# Altium schematic symbol library BARKO_SCHLIB.SchLib: 1064 symbols (part 10 of 11)
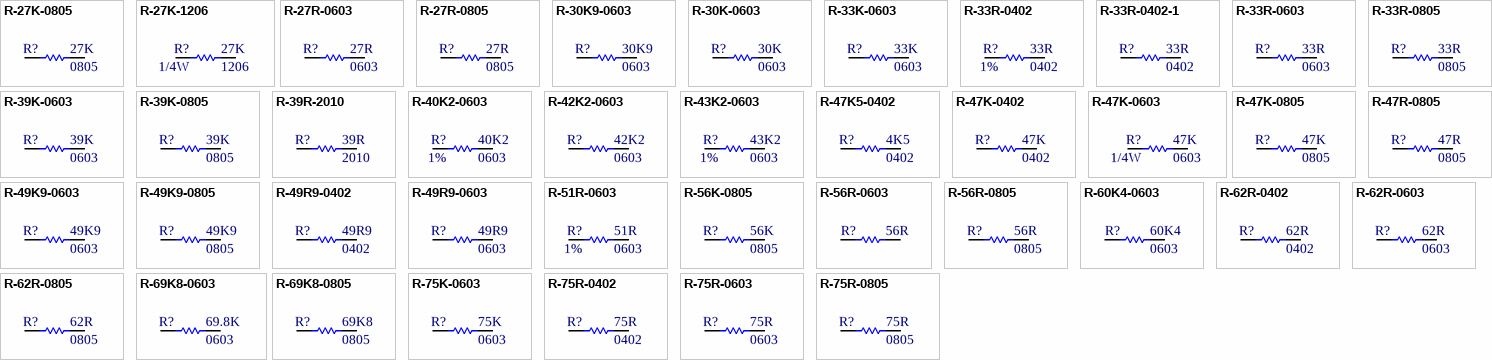
[diagram p50: symbols R-27K-0805 to R-75R-0805]

## R-39K-0603
designator R?, comment 39K  Case Code (Imperial): 0603
RES SMD 39K OHM 5% 1/10W 0603; Manufacturer: Yageo; Manufacturer Part Number: RC0603JR-0739KL; Voltage Rating (DC): 50V; Resistance: 39kR; Power Rating: 100mW; Voltage Rating: 75V; Temperature Coefficient: 100ppm/°C; .PCBCHK: USED; .Creator: F:TALI; Washability: OK; Stock 1: 0; Pricing 1: 1=0.1, 10=0.022, 100=0.0088, 1000=0.00396, 2500=0.00344 (USD); Case/Package: 0603; Number of Pins: 2; Weight: 7.1E-05oz; Case Code (Metric): 1608; Min Operating Temperature: -55°C; Max Operating Temperature: 155°C; Tolerance: 5%; Package Quantity: 1; Packaging: Tape and Reel; Composition: Thick Film; Number of Terminations: 2; Termination: SMD/SMT; Military Standard: Not; Max Power Dissipation: 100mW; Features: Moisture Resistant; Length: 1.6mm; Height: 0.022inch; Width: 0.8mm; Depth: 0.8mm; REACH SVHC: No SVHC; Lead Free: Lead Free; ComponentLink1URL: http://www.yageo.com/documents/recent/PYu-RC_Group_51_RoHS_L_9.pdf; ComponentLink1Description: http://www.yageo.com/documents/recent/PYu-RC_Group_51_RoHS_L_9.pdf; Stock 2: 365350; Pricing 2: 1=0.1, 10=0.043, 100=0.0176, 1000=0.00791, 2500=0.00686 (USD); Mount: Surface Mount; Contact Plating: Tin; Radiation Hardening: No; ComponentLink2URL: http://www.farnell.com/datasheets/1678796.pdf; ComponentLink2Description: http://www.farnell.com/datasheets/1678796.pdf; ComponentLink3URL: https://www.alliedelec.com/m/d/51cd0790071e1666bdb9d00c57fcf960.pdf; ComponentLink3Description: https://www.alliedelec.com/m/d/51cd0790071e1666bdb9d00c57fcf960.pdf; ComponentLink4URL: http://www.jameco.com/Jameco/Products/ProdDS/1988786.pdf; ComponentLink4Description: http://www.jameco.com/Jameco/Products/ProdDS/1988786.pdf; ComponentLink5URL: http://industrial.panasonic.com/www-data/pdf/AOA0000/AOA0000CE1.pdf; ComponentLink5Description: http://industrial.panasonic.com/www-data/pdf/AOA0000/AOA0000CE1.pdf; ComponentLink6URL: http://www.farnell.com/datasheets/1500035.pdf; ComponentLink6Description: http://www.farnell.com/datasheets/1500035.pdf; Stock 3: 400871; Pricing 3: 1=0.1, 10=0.065, 100=0.0264, 1000=0.01186, 2500=0.01029 (USD); ComponentLink7URL: http://www.farnell.com/datasheets/1678782.pdf; ComponentLink7Description: http://www.farnell.com/datasheets/1678782.pdf; ComponentLink8URL: http://industrial.panasonic.com/www-data/pdf/AOA0000/AOA0000CE2.pdf; ComponentLink8Description: http://industrial.panasonic.com/www-data/pdf/AOA0000/AOA0000CE2.pdf; ComponentLink9URL: http://www.mouser.com/ds/2/315/AOA0000C283-1093288.pdf; ComponentLink9Description: http://www.mouser.com/ds/2/315/AOA0000C283-1093288.pdf; ComponentLink10URL: http://www.farnell.com/datasheets/1911175.pdf; ComponentLink10Description: http://www.farnell.com/datasheets/1911175.pdf; ComponentLink11URL: http://www.farnell.com/datasheets/443971.pdf; ComponentLink11Description: http://www.farnell.com/datasheets/443971.pdf; .SCHCHK: USED; Supplier 1: Digi-Key; Supplier Part Number 1: 311-39KGRDKR-ND
footprint R-0603
pins: 1, 2

## R-39K-0805
designator R?, comment 39K  Case Code (Imperial): 0805
RES SMD 39K OHM 5% 1/8W 0805; Manufacturer: Yageo; Manufacturer Part Number: RC0805JR-0739KL; Resistance: 39kR; Temperature Coefficient: 100ppm/°C; Power Rating: 125mW; Voltage Rating: 150V; .PCBCHK: USED; .Creator: F:TALI; Washability: OK; Stock 1: 190; Pricing 1: 1=0.1, 10=0.039, 100=0.0159, 1000=0.00716, 2500=0.00622 (USD); Case/Package: 0805; Contact Plating: Lead,Matte,Tin; Case Code (Metric): 2012; Min Operating Temperature: -55°C; Max Operating Temperature: 155°C; Tolerance: 5%; Composition: Thick Film; Packaging: Tape and Reel; Package Quantity: 1; Termination: SMD/SMT; Number of Terminations: 2; Military Standard: Not; Max Power Dissipation: 125mW; Features: Moisture Resistant; Length: 2mm; Height: 0.024inch; Width: 1.25mm; Depth: 1.25mm; Radiation Hardening: No; REACH SVHC: Unknown; Lead Free: Lead Free; ComponentLink1URL: http://www.yageo.ru/pdf/RC0805.pdf; ComponentLink1Description: http://www.yageo.ru/pdf/RC0805.pdf; ComponentLink2URL: http://www.yageo.com.tw/exep/pages/download/literatures/PYu-R_INT-thick_7.pdf; ComponentLink2Description: http://www.yageo.com.tw/exep/pages/download/literatures/PYu-R_INT-thick_7.pdf; ComponentLink3URL: http://www.yageo.com/documents/recent/PYu-RC_Group_51_RoHS_L_9.pdf; ComponentLink3Description: http://www.yageo.com/documents/recent/PYu-RC_Group_51_RoHS_L_9.pdf; Stock 2: 729088; Pricing 2: 1=0.1, 10=0.081, 100=0.0311, 1000=0.01367, 2500=0.01181 (USD); Mount: Surface Mount; Number of Pins: 2; Weight: 0.000194oz; Voltage Rating (DC): 150V; Working Voltage: 150V; ComponentLink4URL: http://www.farnell.com/datasheets/426256.pdf; ComponentLink4Description: http://www.farnell.com/datasheets/426256.pdf; ComponentLink5URL: https://industrial.panasonic.com/cdbs/www-data/pdf/RDA0000/DMA0000COL11.pdf; ComponentLink5Description: https://industrial.panasonic.com/cdbs/www-data/pdf/RDA0000/DMA0000COL11.pdf; ComponentLink6URL: https://industrial.panasonic.com/cdbs/www-data/pdf/RDA0000/AOA0000C304.pdf; ComponentLink6Description: https://industrial.panasonic.com/cdbs/www-data/pdf/RDA0000/AOA0000C304.pdf; ComponentLink7URL: http://www.farnell.com/datasheets/1678782.pdf; ComponentLink7Description: http://www.farnell.com/datasheets/1678782.pdf; Stock 3: 342774; Pricing 3: 1=0.1, 10=0.021, 100=0.0086, 1000=0.00385, 2500=0.00334 (USD); .SCHCHK: USED; Supplier 1: Digi-Key; Supplier Part Number 1: RMCF0805JT39K0DKR-ND
footprint R-0805
pins: 1, 2

## R-39R-2010
designator R?, comment 39R  Package / Case: 2010
CRGP 2010 39R 1%; Manufacturer: TE Connectivity; Manufacturer Part Number: CRGP2010F39R; .Creator: M.OZKAN; .PCBCHK: USED; Supplier 1: Digi-Key; Supplier Part Number 1: A130643CT-ND; Stock: 21676; Pricing: 1=0.41, 10=0.315, 100=0.1324, 1000=0.0731 (USD); RoHS: No; .SCHCHK: USED
footprint R-2010
pins: 1, 2

## R-40K2-0603
designator R?, comment 40K2  Tolerance: 1%  Case/Package: 0603
RES 40.2K OHM 1% 1/10W 0603; Manufacturer: Stackpole Electronics; Manufacturer Part Number: RMCF0603FT40K2; Resistance: 40.2kR; Temperature Coefficient: 100ppm/°C; Max Power Dissipation: 100mW; Washability: OK; .Creator: M.OZKAN; .PCBCHK: USED; Supplier 1: Digi-Key; Supplier Part Number 1: RMCF0603FT40K2CT-ND; Stock 1: 104014; Pricing 1: 1=0.10000, 10=0.01600, 100=0.00650, 1000=0.00292, 2500=0.00253 (USD); RoHS: Yes; Mount: Surface Mount; Case Code (Imperial): 0603; Contact Plating: Tin,Matte; Case Code (Metric): 1608; Min Operating Temperature: -55°C; Max Operating Temperature: 155°C; Composition: Thick Film; Packaging: Tape and Reel; Number of Terminations: 2; Features: Automotive AEC-Q200; Power Rating: 100mW; Length: 0.061inch; Height: 0.022inch; Width: 0.031inch; Radiation Hardening: No; Lead Free: Lead Free; ComponentLink1URL: http://components.arrow.com/part/dataview/47804758S9848883N1174?src-supplier=Arrow; ComponentLink1Description: http://components.arrow.com/part/dataview/47804758S9848883N1174?src-supplier=Arrow; ComponentLink2URL: https://www.seielect.com/catalog/SEI-RMCF_RMCP.pdf?src-supplier=Avnet; ComponentLink2Description: https://www.seielect.com/catalog/SEI-RMCF_RMCP.pdf?src-supplier=Avnet; ComponentLink3URL: http://www.seielect.com/Catalog/SEI-RMC.pdf?src-supplier=Future+Electronics; ComponentLink3Description: http://www.seielect.com/Catalog/SEI-RMC.pdf?src-supplier=Future+Electronics; ComponentLink4URL: https://www.seielect.com/catalog/SEI-Packaging.pdf?src-supplier=Digi-Key; ComponentLink4Description: https://www.seielect.com/catalog/SEI-Packaging.pdf?src-supplier=Digi-Key; ComponentLink5URL: https://www.seielect.com/catalog/SEI-RMCF_RMCP.pdf?src-supplier=Avnet+Asia; ComponentLink5Description: https://www.seielect.com/catalog/SEI-RMCF_RMCP.pdf?src-supplier=Avnet+Asia; .SCHCHK: USED
footprint R-0603
pins: 1, 2

## R-42K2-0603
designator R?, comment 42K2  Case Code (Imperial): 0603
RES 42.2K OHM 1% 1/10W 0603; Manufacturer: Stackpole Electronics; Manufacturer Part Number: RMCF0603FT42K2; Power Rating: 100mW; Resistance: 42.2kR; Temperature Coefficient: 100ppm/°C; Washability: OK; .Creator: M.OZKAN; .PCBCHK: USED; Supplier 1: Arrow; Stock 1: 9123; Pricing 1: 1=0,09500, 10=0,01600, 25=0,01590, 100=0,00640, 250=0,00630, 500=0,00620, 1000=0,00370, 3000=0,00230, 6000=0,00190 (USD); RoHS: Yes; Mount: Surface Mount; Case/Package: 0603; Case Code (Metric): 1608; Contact Plating: Tin,Matte; Min Operating Temperature: -55°C; Max Operating Temperature: 155°C; Packaging: Tape and Reel; Tolerance: 1%; Composition: Thick Film; Number of Terminations: 2; Military Standard: Not; Max Power Dissipation: 100mW; Features: Automotive AEC-Q200; Length: 1.55mm; Height: 0.022inch; Width: 0.031inch; Depth: 0.8mm; Radiation Hardening: No; Lead Free: Lead Free; ComponentLink1URL: http://components.arrow.com/part/dataview/44987958S7722041N1174?src-supplier=Arrow; ComponentLink1Description: http://components.arrow.com/part/dataview/44987958S7722041N1174?src-supplier=Arrow; ComponentLink2URL: https://www.seielect.com/catalog/SEI-Packaging.pdf?src-supplier=Digi-Key; ComponentLink2Description: https://www.seielect.com/catalog/SEI-Packaging.pdf?src-supplier=Digi-Key; ComponentLink3URL: https://www.seielect.com/Catalog/SEI-RMCF_RMCP.pdf?src-supplier=Digi-Key; ComponentLink3Description: https://www.seielect.com/Catalog/SEI-RMCF_RMCP.pdf?src-supplier=Digi-Key; ComponentLink4URL: https://www.verical.com/server-webapp/html/getDatasheet?partID=422319&src-supplier=Verical; ComponentLink4Description: https://www.verical.com/server-webapp/html/getDatasheet?partID=422319&src-supplier=Verical; ComponentLink5URL: http://www.seielect.com/Catalog/SEI-RMC.pdf?src-supplier=Future+Electronics; ComponentLink5Description: http://www.seielect.com/Catalog/SEI-RMC.pdf?src-supplier=Future+Electronics; ComponentLink6URL: https://www.seielect.com/catalog/SEI-RMCF_RMCP.pdf?src-supplier=Avnet; ComponentLink6Description: https://www.seielect.com/catalog/SEI-RMCF_RMCP.pdf?src-supplier=Avnet; Supplier Part Number 1: RMCF0603FT42K2; .SCHCHK: USED
footprint R-0603
pins: 1, 2

## R-43K2-0603
designator R?, comment 43K2  Tolerance: 1%  Case/Package: 0603
RES SMD 43.2K OHM 1% 1/10W 0603; Manufacturer: Stackpole Electronics; Manufacturer Part Number: RMCF0603FT43K2; Max Power Dissipation: 100mW; Temperature Coefficient: 100ppm/°C; Resistance: 43.2kR; .Creator: M.OZKAN; .PCBCHK: USED; Supplier 1: Digi-Key; Supplier Part Number 1: RMCF0603FT43K2CT-ND; Stock: 13062; Pricing: 1=0.1, 10=0.016, 100=0.0065, 1000=0.0029, 2500=0.0025 (USD); RoHS: Yes; Mount: Surface Mount; Case Code (Imperial): 0603; Contact Plating: Tin,Matte; Case Code (Metric): 1608; Min Operating Temperature: -55°C; Max Operating Temperature: 155°C; Features: Automotive AEC-Q200; Power Rating: 100mW; Packaging: Tape and Reel; Composition: Thick Film; Number of Terminations: 2; Military Standard: Not; Length: 0.061inch; Height: 0.022inch; Width: 0.031inch; Depth: 0.8mm; Radiation Hardening: No; Lead Free: Lead Free; ComponentLink1URL: https://datasheet.ciiva.com/26919/getdatasheetpartid-733470-26919527.pdf?src-supplier=Verical; ComponentLink1Description: https://datasheet.ciiva.com/26919/getdatasheetpartid-733470-26919527.pdf?src-supplier=Verical; .SCHCHK: USED
footprint R-0603
pins: 1, 2

## R-47K5-0402
designator R?, comment 4K5  Case Code (Imperial): 0402
RES SMD 47.5K OHM 1% 1/16W 0402; Manufacturer: Vishay Dale; Manufacturer Part Number: CRCW040247K5FKEDC; Resistance: 47.5kR; Power Rating: 62.5mW; Voltage Rating: 50V; Temperature Coefficient: 100ppm/°C; Max Power Dissipation: 100mW; .PCBCHK: USED; .Creator: F:TALI; Washability: OK; Stock 1: 266682; Pricing 1: 1=0.1, 10=0.026, 100=0.0104, 1000=0.00466, 2500=0.00405, 5000=0.00334 (USD); Stock 2: 2901452; Pricing 2: 1=0.1, 10=0.018, 100=0.0073, 1000=0.00329, 2500=0.00286, 5000=0.00236 (USD); Case/Package: 0402; Case Code (Metric): 1005; Min Operating Temperature: -55°C; Max Operating Temperature: 155°C; Tolerance: 1%; Packaging: Tape and Reel; Termination: SMD/SMT; Composition: Thick Film; Military Standard: Not; Voltage Rating (DC): 50V; Length: 1mm; Depth: 0.5mm; REACH SVHC: No SVHC; Lead Free: Lead Free; ComponentLink1URL: http://www.yageo.com/documents/recent/PYu-RC0402_51_RoHS_L_6_r.pdf; ComponentLink1Description: http://www.yageo.com/documents/recent/PYu-RC0402_51_RoHS_L_6_r.pdf; ComponentLink2URL: http://www.farnell.com/datasheets/1018594.pdf; ComponentLink2Description: http://www.farnell.com/datasheets/1018594.pdf; ComponentLink3URL: http://www.mouser.com/ds/2/447/PYu-RC0402_51_RoHS_L_6_r-8721.pdf; ComponentLink3Description: http://www.mouser.com/ds/2/447/PYu-RC0402_51_RoHS_L_6_r-8721.pdf; Stock 3: 1296555; Pricing 3: 1=0.1, 10=0.045, 100=0.0183, 1000=0.00823, 2500=0.00715, 5000=0.0059 (USD); Mount: Surface Mount; Contact Plating: Tin; Package Quantity: 1; Number of Terminations: 2; Features: Automotive AEC-Q200; Height: 0.35mm; Width: 0.02inch; ComponentLink4URL: http://www.alliedelec.com/m/d/623f45ff1957d936ff56d46fd1c28cac.pdf; ComponentLink4Description: http://www.alliedelec.com/m/d/623f45ff1957d936ff56d46fd1c28cac.pdf; ComponentLink5URL: http://www.farnell.com/datasheets/1911175.pdf; ComponentLink5Description: http://www.farnell.com/datasheets/1911175.pdf; ComponentLink6URL: http://www.farnell.com/datasheets/426256.pdf; ComponentLink6Description: http://www.farnell.com/datasheets/426256.pdf; .SCHCHK: USED; Supplier 1: Digi-Key; Supplier Part Number 1: 311-47.5KLRCT-ND
footprint R-0402
pins: 1, 2

## R-47K-0402
designator R?, comment 47K  Case/Package: 0402
RES 47K OHM 5% 1/16W 0402; Manufacturer: Stackpole Electronics; Manufacturer Part Number: RMCF0402JT47K0; Resistance: 47kR; Power Rating: 63mW; Temperature Coefficient: 100ppm/°C; Washability: OK; .Creator: M.OZKAN; .PCBCHK: USED; Supplier 1: Digi-Key; Stock 1: 178723; Pricing 1: 1=0.10000, 10=0.01200, 100=0.00480, 1000=0.00214, 2500=0.00186, 5000=0.00154 (USD); RoHS: Yes; Mount: Surface Mount; Case Code (Metric): 1005; Case Code (Imperial): 0402; Contact Plating: Tin,Matte; Min Operating Temperature: -55°C; Max Operating Temperature: 155°C; Tolerance: 5%; Packaging: Tape and Reel; Composition: Thick Film; Number of Terminations: 2; Max Power Dissipation: 63mW; Features: Automotive AEC-Q200; Length: 0.039inch; Height: 0.016inch; Width: 0.02inch; Lead Free: Lead Free; ComponentLink1URL: http://components.arrow.com/part/dataview/50586133S9963687N1174?src-supplier=Arrow; ComponentLink1Description: http://components.arrow.com/part/dataview/50586133S9963687N1174?src-supplier=Arrow; ComponentLink2URL: http://www.seielect.com/Catalog/SEI-rmc.pdf?src-supplier=Future+Electronics; ComponentLink2Description: http://www.seielect.com/Catalog/SEI-rmc.pdf?src-supplier=Future+Electronics; ComponentLink3URL: https://www.seielect.com/Catalog/SEI-RMCF_RMCP.pdf?src-supplier=Avnet; ComponentLink3Description: https://www.seielect.com/Catalog/SEI-RMCF_RMCP.pdf?src-supplier=Avnet; ComponentLink4URL: https://www.seielect.com/catalog/SEI-Packaging.pdf?src-supplier=Digi-Key; ComponentLink4Description: https://www.seielect.com/catalog/SEI-Packaging.pdf?src-supplier=Digi-Key; Supplier Part Number 1: RMCF0402JT47K0CT-ND; .SCHCHK: USED
footprint R-0402
pins: 1, 2

## R-47K-0603
designator R?, comment 47K  Max Power Dissipation: 1/4W  Case Code (Imperial): 0603
RES SMD 47K OHM 5% 1/4W 0603; Manufacturer: Panasonic; Manufacturer Part Number: ERJ-PA3J473V; Resistance: 47kR; Temperature Coefficient: 200ppm/°C; Power Rating: 63mW; Voltage Rating: 75V; .PCBCHK: USED; .Creator: F:TALI; Washability: OK; Stock 1: 1868; Pricing 1: 1=0.11, 10=0.1, 100=0.0384, 1000=0.0169, 2500=0.0146 (USD); Case/Package: 0603; Case Code (Metric): 1608; Min Operating Temperature: -55°C; Max Operating Temperature: 155°C; Packaging: Tape and Reel; Composition: Thick Film; Number of Terminations: 2; Tolerance: 5%; Features: Automotive AEC-Q200; Length: 0.063inch; Height: 0.018inch; Width: 0.031inch; Stock 2: 37656; Pricing 2: 1=0.1, 10=0.087, 100=0.0333, 1000=0.01464, 2500=0.01264 (USD); Package Quantity: 1; ComponentLink1URL: http://www.rohm.com/web/global/datasheet/ESR01MZPF/esr-e; ComponentLink1Description: http://www.rohm.com/web/global/datasheet/ESR01MZPF/esr-e; ComponentLink2URL: https://www.rohm.com/datasheet/ESR01MZPF/esr-e; ComponentLink2Description: https://www.rohm.com/datasheet/ESR01MZPF/esr-e; Stock 3: 71198; Pricing 3: 1=0.11, 10=0.098, 100=0.0376, 1000=0.01654, 2500=0.01428 (USD); Number of Pins: 2; Voltage Rating (DC): 75V; Termination: SMD/SMT; Depth: 0.8mm; REACH SVHC: Unknown; Lead Free: Lead Free; ComponentLink3URL: http://documents.rs-components.com/techlib://itc_doclist_GB.htm?stockno=3915371; ComponentLink3Description: http://documents.rs-components.com/techlib://itc_doclist_GB.htm?stockno=3915371; ComponentLink4URL: http://www.farnell.com/datasheets/87330.pdf; ComponentLink4Description: http://www.farnell.com/datasheets/87330.pdf; .SCHCHK: USED; Supplier 1: Digi-Key; Supplier Part Number 1: P47KBZDKR-ND
footprint R-0603
pins: 1, 2

## R-47K-0805
designator R?, comment 47K  Case Code (Imperial): 0805
RES SMD 47K 1/8W 5% 0805; Manufacturer: Samsung; Manufacturer Part Number: RC2012J473CS; Resistance: 47kR; Temperature Coefficient: 100ppm/°C; Power Rating: 125mW; Voltage Rating (DC): 150V; .PCBCHK: USED; .Creator: F:TALI; Washability: OK; Case/Package: 0805; Contact Plating: Tin; Case Code (Metric): 2012; Min Operating Temperature: -55°C; Max Operating Temperature: 155°C; Tolerance: 5%; Composition: Thick Film; Packaging: Tape and Reel; Number of Terminations: 2; Military Standard: Not; Max Power Dissipation: 125mW; Features: Moisture Resistant; Length: 0.079inch; Height: 0.024inch; Width: 0.049inch; Depth: 1.25mm; Radiation Hardening: No; Lead Free: Lead Free; Stock 1: 15535; Pricing 1: 1=0.19, 10=0.16, 100=0.0624, 1000=0.02614, 2500=0.02396 (USD); Package Quantity: 1; ComponentLink1URL: http://www.rohm.com/web/global/datasheet/KTR03EZPF/ktr-e; ComponentLink1Description: http://www.rohm.com/web/global/datasheet/KTR03EZPF/ktr-e; Mount: Surface Mount; ComponentLink2URL: http://www.te.com/commerce/DocumentDelivery/DDEController?Action=srchrtrv&DocNm=1773204&DocType=DS&DocLang=English; ComponentLink2Description: http://www.te.com/commerce/DocumentDelivery/DDEController?Action=srchrtrv&DocNm=1773204&DocType=DS&DocLang=English; ComponentLink3URL: http://www.te.com/commerce/DocumentDelivery/DDEController?Action=showdoc&DocId=Data+Sheet%7F1773204%7FF%7Fpdf%7FEnglish%7FENG_DS_1773204_F.pdf; ComponentLink3Description: http://www.te.com/commerce/DocumentDelivery/DDEController?Action=showdoc&DocId=Data+Sheet%7F1773204%7FF%7Fpdf%7FEnglish%7FENG_DS_1773204_F.pdf; ComponentLink4URL: http://www.onlinecomponents.com/productFiles/mf-AMP/eng_ds_1773204_e.pdf; ComponentLink4Description: http://www.onlinecomponents.com/productFiles/mf-AMP/eng_ds_1773204_e.pdf; Stock 2: 4221239; Pricing 2: 1=0.1, 10=0.046, 100=0.0186, 1000=0.00835, 2500=0.00725 (USD); Number of Pins: 2; Voltage Rating: 150V; Termination: SMD/SMT; REACH SVHC: Unknown; ComponentLink5URL: http://www.farnell.com/datasheets/1686128.pdf; ComponentLink5Description: http://www.farnell.com/datasheets/1686128.pdf; ComponentLink6URL: http://www.farnell.com/datasheets/444164.pdf; ComponentLink6Description: http://www.farnell.com/datasheets/444164.pdf; ComponentLink7URL: http://www.yageo.ru/pdf/RC0805.pdf; ComponentLink7Description: http://www.yageo.ru/pdf/RC0805.pdf; Stock 3: 763547; Pricing 3: 1=0.1, 10=0.061, 100=0.0249, 1000=0.0112, 2500=0.00972 (USD); Working Voltage: 150V; ComponentLink8URL: http://www.farnell.com/datasheets/2371628.pdf; ComponentLink8Description: http://www.farnell.com/datasheets/2371628.pdf; ComponentLink9URL: http://industrial.panasonic.com/www-data/pdf/AOA0000/AOA0000CE1.pdf; ComponentLink9Description: http://industrial.panasonic.com/www-data/pdf/AOA0000/AOA0000CE1.pdf; ComponentLink10URL: http://www.mouser.com/ds/2/315/AOA0000CE1-37422.pdf; ComponentLink10Description: http://www.mouser.com/ds/2/315/AOA0000CE1-37422.pdf; ComponentLink11URL: https://industrial.panasonic.com/cdbs/www-data/pdf/RDA0000/AOA0000C301.pdf; ComponentLink11Description: https://industrial.panasonic.com/cdbs/www-data/pdf/RDA0000/AOA0000C301.pdf; ComponentLink12URL: http://www.farnell.com/datasheets/1500035.pdf; ComponentLink12Description: http://www.farnell.com/datasheets/1500035.pdf; ComponentLink13URL: http://www.farnell.com/datasheets/2059623.pdf; ComponentLink13Description: http://www.farnell.com/datasheets/2059623.pdf; ComponentLink14URL: http://www.farnell.com/datasheets/1678796.pdf; ComponentLink14Description: http://www.farnell.com/datasheets/1678796.pdf; .SCHCHK: USED; Supplier 1: Digi-Key; Supplier Part Number 1: RHM47.0KAHDKR-ND
footprint R-0805
pins: 1, 2

## R-47R-0805
designator R?, comment 47R  Case/Package: 0805
RES SMD 47 OHM 1% 1/8W 0805; Manufacturer: Yageo; Manufacturer Part Number: RC0805FR-0747RL; Temperature Coefficient: 100ppm/°C; Power Rating: 125mW; Voltage Rating: 150V; .PCBCHK: USED; .Creator: F:TALI; Washability: OK; Stock 1: 122904; Pricing 1: 1=0.1, 10=0.046, 100=0.0186, 1000=0.00835, 2500=0.00725 (USD); Case Code (Metric): 2012; Case Code (Imperial): 0805; Min Operating Temperature: -55°C; Max Operating Temperature: 155°C; Resistance: 47R; Tolerance: 1%; Composition: Thick Film; Packaging: Tape and Reel; Package Quantity: 1; Number of Terminations: 2; Termination: SMD/SMT; Military Standard: Not; Max Power Dissipation: 125mW; Features: Moisture Resistant; Length: 2mm; Height: 0.024inch; Width: 0.049inch; Depth: 1.25mm; REACH SVHC: Unknown; Lead Free: Lead Free; ComponentLink1URL: http://documents.rs-components.com/techlib://itc_doclist_GB.htm?stockno=6182574; ComponentLink1Description: http://documents.rs-components.com/techlib://itc_doclist_GB.htm?stockno=6182574; ComponentLink2URL: http://www.yageo.com/documents/recent/PYu-RC_Group_51_RoHS_L_9.pdf; ComponentLink2Description: http://www.yageo.com/documents/recent/PYu-RC_Group_51_RoHS_L_9.pdf; ComponentLink3URL: http://www.yageo.ru/pdf/RC0805.pdf; ComponentLink3Description: http://www.yageo.ru/pdf/RC0805.pdf; ComponentLink4URL: http://www.farnell.com/datasheets/444164.pdf; ComponentLink4Description: http://www.farnell.com/datasheets/444164.pdf; ComponentLink5URL: http://www.mouser.com/ds/2/447/Yageo_08112016_RC0805-968729.pdf; ComponentLink5Description: http://www.mouser.com/ds/2/447/Yageo_08112016_RC0805-968729.pdf; Stock 2: 717764; Pricing 2: 1=0.1, 10=0.061, 100=0.0249, 1000=0.0112, 2500=0.00972 (USD); Mount: Surface Mount; Contact Plating: Tin; Voltage Rating (DC): 150V; Radiation Hardening: No; ComponentLink6URL: http://farnell.com//datasheets/2371628.pdf; ComponentLink6Description: http://farnell.com//datasheets/2371628.pdf; ComponentLink7URL: https://www.alliedelec.com/m/d/51cd0790071e1666bdb9d00c57fcf960.pdf; ComponentLink7Description: https://www.alliedelec.com/m/d/51cd0790071e1666bdb9d00c57fcf960.pdf; ComponentLink8URL: http://www.farnell.com/datasheets/1678796.pdf; ComponentLink8Description: http://www.farnell.com/datasheets/1678796.pdf; ComponentLink9URL: http://www.farnell.com/datasheets/1500035.pdf; ComponentLink9Description: http://www.farnell.com/datasheets/1500035.pdf; ComponentLink10URL: https://www.verical.com/server-webapp/html/getDatasheet?partID=249048; ComponentLink10Description: https://www.verical.com/server-webapp/html/getDatasheet?partID=249048; ComponentLink11URL: http://industrial.panasonic.com/www-data/pdf/AOA0000/AOA0000CE1.pdf; ComponentLink11Description: http://industrial.panasonic.com/www-data/pdf/AOA0000/AOA0000CE1.pdf; ComponentLink12URL: http://www.jameco.com/Jameco/Products/ProdDS/1989914.pdf; ComponentLink12Description: http://www.jameco.com/Jameco/Products/ProdDS/1989914.pdf; Stock 3: 137564; Pricing 3: 1=0.1, 10=0.021, 100=0.0086, 1000=0.00385, 2500=0.00334 (USD); .SCHCHK: USED; Supplier 1: Digi-Key; Supplier Part Number 1: 311-47.0CRDKR-ND
footprint R-0805
pins: 1, 2

## R-49K9-0603
designator R?, comment 49K9  Case Code (Imperial): 0603
RES SMD 49.9K OHM 1% 1/10W 0603; Manufacturer: Yageo; Manufacturer Part Number: RC0603FR-0749K9L; Power Rating: 100mW; Resistance: 49.9kR; Temperature Coefficient: 100ppm/°C; Voltage Rating (DC): 50V; .PCBCHK: USED; .Creator: F:TALI; Washability: OK; Stock 1: 4878176; Pricing 1: 1=0.1, 10=0.026, 100=0.0107, 1000=0.00478, 2500=0.00415 (USD); Mount: Surface Mount; Case/Package: 0603; Case Code (Metric): 1608; Min Operating Temperature: -55°C; Max Operating Temperature: 155°C; Tolerance: 1%; Packaging: Tape and Reel; Package Quantity: 1; Voltage Rating: 50V; Composition: Thick Film; Number of Terminations: 2; Termination: SMD/SMT; Military Standard: Not; Max Power Dissipation: 100mW; Features: Moisture Resistant; Length: 0.063inch; Height: 0.022inch; Width: 0.031inch; Depth: 0.8mm; Lead Free: Lead Free; ComponentLink1URL: http://documents.rs-components.com/techlib://itc_doclist_GB.htm?stockno=5047537; ComponentLink1Description: http://documents.rs-components.com/techlib://itc_doclist_GB.htm?stockno=5047537; ComponentLink2URL: https://www.verical.com/server-webapp/html/getDatasheet?partID=323805; ComponentLink2Description: https://www.verical.com/server-webapp/html/getDatasheet?partID=323805; ComponentLink3URL: http://www.yageo.com/documents/recent/PYu-RC_Group_51_RoHS_L_9.pdf; ComponentLink3Description: http://www.yageo.com/documents/recent/PYu-RC_Group_51_RoHS_L_9.pdf; Stock 2: 1796687; Pricing 2: 1=0.1, 10=0.065, 100=0.0264, 1000=0.01186, 2500=0.01029 (USD); Weight: 7.1E-05oz; Contact Plating: Tin; Radiation Hardening: No; REACH SVHC: No SVHC; ComponentLink4URL: http://www.farnell.com/datasheets/1911175.pdf; ComponentLink4Description: http://www.farnell.com/datasheets/1911175.pdf; ComponentLink5URL: http://www.farnell.com/datasheets/426256.pdf; ComponentLink5Description: http://www.farnell.com/datasheets/426256.pdf; ComponentLink6URL: http://industrial.panasonic.com/www-data/pdf/AOA0000/AOA0000CE2.pdf; ComponentLink6Description: http://industrial.panasonic.com/www-data/pdf/AOA0000/AOA0000CE2.pdf; ComponentLink7URL: http://www.farnell.com/datasheets/1678782.pdf; ComponentLink7Description: http://www.farnell.com/datasheets/1678782.pdf; ComponentLink8URL: https://www.verical.com/server-webapp/html/getDatasheet?partID=52039; ComponentLink8Description: https://www.verical.com/server-webapp/html/getDatasheet?partID=52039; ComponentLink9URL: http://www.jameco.com/Jameco/Products/ProdDS/1988209.pdf; ComponentLink9Description: http://www.jameco.com/Jameco/Products/ProdDS/1988209.pdf; Stock 3: 57477; Pricing 3: 1=0.1, 10=0.032, 100=0.0129, 1000=0.00579, 2500=0.00502 (USD); .SCHCHK: USED; Supplier 1: Digi-Key; Supplier Part Number 1: 311-49.9KHRCT-ND
footprint R-0603
pins: 1, 2

## R-49K9-0805
designator R?, comment 49K9  Case Code (Imperial): 0805
RES SMD 49.9K OHM 1% 1/8W 0805; Manufacturer: Stackpole Electronics; Manufacturer Part Number: RMCF0805FT49K9; Resistance: 49.9kR; Temperature Coefficient: 100ppm/°C; Power Rating: 125mW; Voltage Rating: 100V; .PCBCHK: USED; .Creator: F:TALI; Washability: OK; Supplier 1: Digi-Key; Supplier Part Number 1: RMCF0805FT49K9DKR-ND; Stock 1: 71857; Pricing 1: 1=0.1, 10=0.028, 100=0.0114, 1000=0.00513, 2500=0.00445 (USD); Mount: Surface Mount; Case/Package: 0805; Case Code (Metric): 2012; Contact Plating: Matte,Tin; Min Operating Temperature: -55°C; Max Operating Temperature: 155°C; Packaging: Tape and Reel; Tolerance: 1%; Composition: Thick Film; Number of Terminations: 2; Max Power Dissipation: 125mW; Package Quantity: 1; Military Standard: Not; Features: Automotive AEC-Q200; Length: 2mm; Height: 0.026inch; Width: 0.049inch; Depth: 1.25mm; Radiation Hardening: No; Lead Free: Lead Free; Weight: 0.000194oz; Voltage Rating (DC): 100V; Termination: SMD/SMT; REACH SVHC: Unknown; .SCHCHK: USED
footprint R-0805
pins: 1, 2

## R-49R9-0402
designator R?, comment 49R9  Case Code (Imperial): 0402
RES SMD 49.9 OHM 1% 1/16W 0402; Manufacturer: Vishay Semiconductors; Manufacturer Part Number: CRCW040249R9FKEDC; Temperature Coefficient: 100ppm/°C; Resistance: 49.9R; Power Rating: 62.5mW; Max Power Dissipation: 63mW; Voltage Rating: 50V; .PCBCHK: USED; .Creator: F:TALI; Washability: OK; Stock 1: 1212049; Pricing 1: 1=0.1, 10=0.026, 100=0.0104, 1000=0.00466, 2500=0.00405, 5000=0.00334 (USD); Mount: Surface Mount; Case/Package: SMD/SMT; Contact Plating: Tin; Min Operating Temperature: -55°C; Max Operating Temperature: 155°C; Composition: Thick Film; Tolerance: 1%; Termination: Wraparound; Length: 1mm; Lead Free: Lead Free; Stock 2: 2233063; Pricing 2: 1=0.1, 10=0.021, 100=0.0087, 1000=0.00391, 2500=0.00339, 5000=0.0028 (USD); Case Code (Metric): 1005; Packaging: Tape and Reel; Military Standard: Not; Number of Terminations: 2; Features: Moisture Resistant; Height: 0.016inch; Width: 0.02inch; Depth: 0.5mm; Radiation Hardening: No; ComponentLink1URL: https://www.verical.com/server-webapp/html/getDatasheet?partID=644783; ComponentLink1Description: https://www.verical.com/server-webapp/html/getDatasheet?partID=644783; ComponentLink2URL: http://www1.futureelectronics.com/doc/SAMSUNG/RCSERIES.pdf; ComponentLink2Description: http://www1.futureelectronics.com/doc/SAMSUNG/RCSERIES.pdf; ComponentLink3URL: https://produktinfo.conrad.com/datenblaetter/625000-649999/631101-da-01-en-SMD_WID_RC_1005_49R9_1__0_063W_10000ST.pdf; ComponentLink3Description: https://produktinfo.conrad.com/datenblaetter/625000-649999/631101-da-01-en-SMD_WID_RC_1005_49R9_1__0_063W_10000ST.pdf; Stock 3: 74971; Pricing 3: 1=0.12, 10=0.107, 100=0.0412, 1000=0.01815, 2500=0.01567, 5000=0.01402 (USD); Package Quantity: 10000; ComponentLink4URL: http://www.mouser.com/ds/2/315/AOA0000C283-1093288.pdf; ComponentLink4Description: http://www.mouser.com/ds/2/315/AOA0000C283-1093288.pdf; Voltage Rating (DC): 50V; REACH SVHC: No SVHC; ComponentLink5URL: http://industrial.panasonic.com/www-data/pdf/AOA0000/AOA0000CE1.pdf; ComponentLink5Description: http://industrial.panasonic.com/www-data/pdf/AOA0000/AOA0000CE1.pdf; ComponentLink6URL: http://www.farnell.com/datasheets/1500035.pdf; ComponentLink6Description: http://www.farnell.com/datasheets/1500035.pdf; ComponentLink7URL: https://www.alliedelec.com/m/d/51cd0790071e1666bdb9d00c57fcf960.pdf; ComponentLink7Description: https://www.alliedelec.com/m/d/51cd0790071e1666bdb9d00c57fcf960.pdf; ComponentLink8URL: http://www.farnell.com/datasheets/1678796.pdf; ComponentLink8Description: http://www.farnell.com/datasheets/1678796.pdf; ComponentLink9URL: http://www.farnell.com/datasheets/2059623.pdf; ComponentLink9Description: http://www.farnell.com/datasheets/2059623.pdf; .SCHCHK: USED; Supplier 1: Digi-Key; Supplier Part Number 1: 1276-3469-1-ND
footprint R-0402
pins: 1, 2

## R-49R9-0603
designator R?, comment 49R9  Case/Package: 0603
RES 49.9 OHM 1% 1/10W 0603; Manufacturer: Stackpole Electronics; Manufacturer Part Number: RMCF0603FT49R9; Resistance: 49.9R; Power Rating: 100mW; Temperature Coefficient: 100ppm/°C; Working Voltage: 75V; Washability: OK; .Creator: M.OZKAN; .PCBCHK: USED; Supplier 1: Digi-Key; Stock 1: 121928; Pricing 1: 1=0.10000, 10=0.01700, 100=0.00680, 1000=0.00306, 2500=0.00266 (USD); RoHS: Yes; Mount: Surface Mount; Case Code (Metric): 1608; Case Code (Imperial): 0603; Contact Plating: Tin; Min Operating Temperature: -55°C; Max Operating Temperature: 155°C; Tolerance: 1%; Packaging: Tape and Reel; Composition: Thick Film; Number of Terminations: 2; Military Standard: Not; Max Power Dissipation: 100mW; Features: Automotive AEC-Q200; Length: 1.55mm; Height: 0.022inch; Width: 0.031inch; Depth: 0.8mm; Radiation Hardening: No; Lead Free: Lead Free; ComponentLink1URL: https://datasheet.ciiva.com/15193/getdatasheetpartid-420887-15193485.pdf?src-supplier=Verical; ComponentLink1Description: https://datasheet.ciiva.com/15193/getdatasheetpartid-420887-15193485.pdf?src-supplier=Verical; Supplier Part Number 1: RMCF0603FT49R9CT-ND; .SCHCHK: USED
footprint R-0603
pins: 1, 2

## R-51R-0603
designator R?, comment 51R  Tolerance: 1%  Case/Package: 0603
RES 51 OHM 1% 1/10W 0603; Manufacturer: Stackpole Electronics; Manufacturer Part Number: RMCF0603FT51R0; Max Power Dissipation: 100mW; Temperature Coefficient: 100ppm/°C; Supplier 1: Digi-Key; Supplier Part Number 1: RMCF0603FT51R0CT-ND; Stock: 90930; Pricing: 1=0.1, 10=0.015, 100=0.0063, 1000=0.0028, 2500=0.0024 (USD); RoHS: Yes; Mount: Surface Mount; Case Code (Imperial): 0603; Case Code (Metric): 1608; Contact Plating: Tin,Matte; Min Operating Temperature: -55°C; Max Operating Temperature: 155°C; Resistance: 51R; Packaging: Tape and Reel; Composition: Thick Film; Number of Terminations: 2; Features: Automotive AEC-Q200; Length: 0.061inch; Height: 0.022inch; Width: 0.031inch; Radiation Hardening: No; Lead Free: Lead Free; ComponentLink1URL: https://www.seielect.com/catalog/SEI-Packaging.pdf?src-supplier=Digi-Key; ComponentLink1Description: https://www.seielect.com/catalog/SEI-Packaging.pdf?src-supplier=Digi-Key; ComponentLink2URL: https://www.seielect.com/catalog/SEI-RMCF_RMCP.pdf?src-supplier=Avnet; ComponentLink2Description: https://www.seielect.com/catalog/SEI-RMCF_RMCP.pdf?src-supplier=Avnet
footprint R-0603
pins: 1, 2

## R-56K-0805
designator R?, comment 56K  Case Code (Imperial): 0805
RES SMD 56K 1/8W 5% 0805; Manufacturer: Stackpole Electronics; Manufacturer Part Number: RMCF0805JT56K0; Resistance: 56kR; Temperature Coefficient: 200ppm/°C; Max Power Dissipation: 125mW; Voltage Rating (DC): 150V; .PCBCHK: USED; .Creator: F:TALI; Washability: OK; Stock 1: 85261; Pricing 1: 1=0.1, 10=0.021, 100=0.0086, 1000=0.00385, 2500=0.00334 (USD); Mount: Surface Mount; Case/Package: 0805; Case Code (Metric): 2012; Contact Plating: Matte,Tin; Min Operating Temperature: -55°C; Max Operating Temperature: 155°C; Tolerance: 5%; Packaging: Tape and Reel; Composition: Thick Film; Number of Terminations: 2; Features: Automotive AEC-Q200; Military Standard: Not; Length: 0.079inch; Height: 0.026inch; Width: 0.049inch; Depth: 1.25mm; Radiation Hardening: No; Lead Free: Lead Free; ComponentLink1URL: https://www.verical.com/server-webapp/html/getDatasheet?partID=542843; ComponentLink1Description: https://www.verical.com/server-webapp/html/getDatasheet?partID=542843; Stock 2: 26609; Pricing 2: 1=0.1, 10=0.081, 100=0.0311, 1000=0.01367, 2500=0.01181 (USD); Number of Pins: 2; Weight: 0.000194oz; Package Quantity: 1; Power Rating: 125mW; Voltage Rating: 150V; Termination: SMD/SMT; REACH SVHC: No SVHC; ComponentLink2URL: http://www.farnell.com/datasheets/426256.pdf; ComponentLink2Description: http://www.farnell.com/datasheets/426256.pdf; ComponentLink3URL: https://www.alliedelec.com/m/d/623f45ff1957d936ff56d46fd1c28cac.pdf; ComponentLink3Description: https://www.alliedelec.com/m/d/623f45ff1957d936ff56d46fd1c28cac.pdf; ComponentLink4URL: http://www.farnell.com/datasheets/1678782.pdf; ComponentLink4Description: http://www.farnell.com/datasheets/1678782.pdf; ComponentLink5URL: http://www.mouser.com/ds/2/315/AOA0000C304-1149620.pdf; ComponentLink5Description: http://www.mouser.com/ds/2/315/AOA0000C304-1149620.pdf; ComponentLink6URL: http://industrial.panasonic.com/www-data/pdf/AOA0000/AOA0000CE2.pdf; ComponentLink6Description: http://industrial.panasonic.com/www-data/pdf/AOA0000/AOA0000CE2.pdf; Stock 3: 285263; Pricing 3: 1=0.1, 10=0.061, 100=0.0249, 1000=0.0112, 2500=0.00972 (USD); ComponentLink7URL: http://industrial.panasonic.com/www-data/pdf/AOA0000/AOA0000CE1.pdf; ComponentLink7Description: http://industrial.panasonic.com/www-data/pdf/AOA0000/AOA0000CE1.pdf; ComponentLink8URL: http://www.farnell.com/datasheets/1678796.pdf; ComponentLink8Description: http://www.farnell.com/datasheets/1678796.pdf; ComponentLink9URL: http://www.farnell.com/datasheets/1500035.pdf; ComponentLink9Description: http://www.farnell.com/datasheets/1500035.pdf; ComponentLink10URL: http://components.arrow.com/part/dataview/3982560S2126259N1386; ComponentLink10Description: http://components.arrow.com/part/dataview/3982560S2126259N1386; ComponentLink11URL: http://www.farnell.com/datasheets/2059623.pdf; ComponentLink11Description: http://www.farnell.com/datasheets/2059623.pdf; ComponentLink12URL: http://www.farnell.com/datasheets/2371628.pdf; ComponentLink12Description: http://www.farnell.com/datasheets/2371628.pdf; ComponentLink13URL: https://www.alliedelec.com/m/d/51cd0790071e1666bdb9d00c57fcf960.pdf; ComponentLink13Description: https://www.alliedelec.com/m/d/51cd0790071e1666bdb9d00c57fcf960.pdf; .SCHCHK: USED; Supplier 1: Digi-Key; Supplier Part Number 1: RMCF0805JT56K0CT-ND
footprint R-0805
pins: 1, 2

## R-56R-0603
designator R?, comment 56R
RES 56 OHM 1% 1/10W 0603; Manufacturer: Stackpole Electronics; Manufacturer Part Number: RMCF0603FT56R0; Max Power Dissipation: 100mW; Temperature Coefficient: 100ppm/°C; Supplier 1: Avnet; Stock 1: 0; Pricing 1: 5000=0.00199, 10000=0.00196, 20000=0.00190, 30000=0.00186, 40000=0.00179 (USD); RoHS: Yes; Mount: Surface Mount; Case/Package: 0603; Case Code (Imperial): 0603; Case Code (Metric): 1608; Contact Plating: Tin,Matte; Min Operating Temperature: -55°C; Max Operating Temperature: 155°C; Package Quantity: 5000; Resistor Type: Thick Film; Number of Terminations: 2; Features: Automotive AEC-Q200; Packaging: Tape and Reel; Resistance: 56R; Tolerance: 1%; Length: 0.061inch; Width: 0.031inch; Height: 0.022inch; Radiation Hardening: No; ComponentLink1URL: https://www.seielect.com/catalog/SEI-RMCF_RMCP.pdf?src-supplier=Avnet; ComponentLink1Description: https://www.seielect.com/catalog/SEI-RMCF_RMCP.pdf?src-supplier=Avnet; ComponentLink2URL: http://www.seielect.com/Catalog/SEI-RMCF_RMCP.pdf?src-supplier=Digi-Key; ComponentLink2Description: http://www.seielect.com/Catalog/SEI-RMCF_RMCP.pdf?src-supplier=Digi-Key; ComponentLink3URL: https://www.seielect.com/Catalog/SEI-RMCF_RMCP.pdf?src-supplier=Digi-Key; ComponentLink3Description: https://www.seielect.com/Catalog/SEI-RMCF_RMCP.pdf?src-supplier=Digi-Key; ComponentLink4URL: https://www.seielect.com/catalog/SEI-Packaging.pdf?src-supplier=Digi-Key; ComponentLink4Description: https://www.seielect.com/catalog/SEI-Packaging.pdf?src-supplier=Digi-Key; Supplier Part Number 1: RMCF0603FT56R0
footprint R-0603
pins: 1, 2

## R-56R-0805
designator R?, comment 56R  Case Code (Imperial): 0805
RES SMD 56 OHM 5% 1/8W 0805; Manufacturer: Vishay Dale; Manufacturer Part Number: CRCW080556R0JNEA; Temperature Coefficient: 200ppm/°C; Max Power Dissipation: 125mW; Voltage Rating: 150V; .PCBCHK: USED; .Creator: F:TALI; Washability: OK; Stock 1: 4554; Pricing 1: 1=0.1, 10=0.044, 100=0.0178, 1000=0.00802, 2500=0.00696 (USD); Mount: Surface Mount; Case/Package: 0805; Number of Pins: 2; Weight: 0.000194oz; Case Code (Metric): 2012; Contact Plating: Tin; Min Operating Temperature: -55°C; Max Operating Temperature: 155°C; Packaging: Tape and Reel; Resistance: 56R; Tolerance: 5%; Composition: Thick Film; Number of Terminations: 2; Military Standard: Not; Power Rating: 125mW; Package Quantity: 1; Termination: SMD/SMT; Features: Automotive AEC-Q200; Voltage Rating (DC): 150V; Length: 2mm; Height: 0.02inch; Width: 1.25mm; Depth: 1.25mm; Radiation Hardening: No; REACH SVHC: Unknown; Lead Free: Lead Free; ComponentLink1URL: http://www.vishay.com/docs/20035/dcrcwe3.pdf; ComponentLink1Description: http://www.vishay.com/docs/20035/dcrcwe3.pdf; Stock 2: 140388; Pricing 2: 1=0.1, 10=0.081, 100=0.0311, 1000=0.01367, 2500=0.01181 (USD); Height - Seated (Max): 0.028inch; ComponentLink2URL: http://www.farnell.com/datasheets/426256.pdf; ComponentLink2Description: http://www.farnell.com/datasheets/426256.pdf; ComponentLink3URL: http://industrial.panasonic.com/www-data/pdf/AOA0000/AOA0000CE2.pdf; ComponentLink3Description: http://industrial.panasonic.com/www-data/pdf/AOA0000/AOA0000CE2.pdf; ComponentLink4URL: https://www.alliedelec.com/m/d/623f45ff1957d936ff56d46fd1c28cac.pdf; ComponentLink4Description: https://www.alliedelec.com/m/d/623f45ff1957d936ff56d46fd1c28cac.pdf; Stock 3: 28287; Pricing 3: 1=0.1, 10=0.021, 100=0.0086, 1000=0.00385, 2500=0.00334 (USD); .SCHCHK: USED; Supplier 1: Digi-Key; Supplier Part Number 1: RMCF0805JT56R0CT-ND
footprint R-0805
pins: 1, 2

## R-60K4-0603
designator R?, comment 60K4  Case/Package: 0603
RES SMD 60.4 KOHM 1% 1/10W 0603; Manufacturer: Stackpole Electronics; Manufacturer Part Number: RMCF0603FT60K4; Max Power Dissipation: 100mW; Temperature Coefficient: 100ppm/°C; Resistance: 60.4kR; Supplier 1: Arrow; Stock 1: 5000; Pricing 1: 1=0,09980, 10=0,01600, 100=0,00650, 1000=0,00290, 2500=0,00250, 5000=0,00220, 5000=0,00190, 500000=0,00170, 2500000=0,00160 (USD); RoHS: Yes; Mount: Surface Mount; Contact Plating: Tin,Matte; Case Code (Metric): 1608; Case Code (Imperial): 0603; Min Operating Temperature: -55°C; Max Operating Temperature: 155°C; Features: Automotive AEC-Q200; Packaging: Tape and Reel; Tolerance: 1%; Composition: Thick Film; Number of Terminations: 2; Military Standard: Not; Length: 1.55mm; Height: 0.022inch; Width: 0.031inch; Depth: 0.8mm; Radiation Hardening: No; ComponentLink1URL: https://www.seielect.com/catalog/SEI-Packaging.pdf?src-supplier=Digi-Key; ComponentLink1Description: https://www.seielect.com/catalog/SEI-Packaging.pdf?src-supplier=Digi-Key; ComponentLink2URL: https://www.seielect.com/catalog/SEI-RMCF_RMCP.pdf?src-supplier=Avnet; ComponentLink2Description: https://www.seielect.com/catalog/SEI-RMCF_RMCP.pdf?src-supplier=Avnet; ComponentLink3URL: https://www.seielect.com/Catalog/SEI-RMCF_RMCP.pdf?src-supplier=Digi-Key; ComponentLink3Description: https://www.seielect.com/Catalog/SEI-RMCF_RMCP.pdf?src-supplier=Digi-Key; ComponentLink4URL: https://www.verical.com/server-webapp/html/getDatasheet?partID=493745&src-supplier=Verical; ComponentLink4Description: https://www.verical.com/server-webapp/html/getDatasheet?partID=493745&src-supplier=Verical; ComponentLink5URL: http://components.arrow.com/part/dataview/47797003S7054871N1174?src-supplier=Arrow; ComponentLink5Description: http://components.arrow.com/part/dataview/47797003S7054871N1174?src-supplier=Arrow; ComponentLink6URL: https://www.seielect.com/catalog/SEI-RMCF_RMCP.pdf?src-supplier=Avnet+Asia; ComponentLink6Description: https://www.seielect.com/catalog/SEI-RMCF_RMCP.pdf?src-supplier=Avnet+Asia; Supplier Part Number 1: RMCF0603FT60K4
footprint R-0603
pins: 1, 2

## R-62R-0402
designator R?, comment 62R  Case Code (Imperial): 0402
RES SMD 62 OHM 1% 1/10W 0402; Manufacturer: Panasonic; Manufacturer Part Number: ERJ-2RKF62R0X; Power Rating: 100mW; Voltage Rating: 50V; Temperature Coefficient: 100ppm/°C; .PCBCHK: USED; .Creator: F:TALI; Washability: OK; Stock 1: 217823; Pricing 1: 1=0.1, 10=0.045, 100=0.0183, 1000=0.00823, 2500=0.00715, 5000=0.0059 (USD); Mount: Surface Mount; Case/Package: 0402; Weight: 2.8E-05oz; Case Code (Metric): 1005; Contact Plating: Tin; Min Operating Temperature: -55°C; Max Operating Temperature: 155°C; Tolerance: 1%; Resistance: 62R; Packaging: Tape and Reel; Package Quantity: 10000; Composition: Thick Film; Termination: SMD/SMT; Number of Terminations: 2; Military Standard: Not; Max Power Dissipation: 100mW; Voltage Rating (DC): 50V; Length: 1mm; Height: 0.35mm; Width: 0.5mm; Depth: 0.5mm; Radiation Hardening: No; REACH SVHC: Yes; Lead Free: Lead Free; ComponentLink1URL: http://www.farnell.com/datasheets/1678782.pdf; ComponentLink1Description: http://www.farnell.com/datasheets/1678782.pdf; ComponentLink2URL: http://industrial.panasonic.com/www-data/pdf/AOA0000/AOA0000CE2.pdf; ComponentLink2Description: http://industrial.panasonic.com/www-data/pdf/AOA0000/AOA0000CE2.pdf; ComponentLink3URL: http://www.mouser.com/ds/2/315/AOA0000C304-1149620.pdf; ComponentLink3Description: http://www.mouser.com/ds/2/315/AOA0000C304-1149620.pdf; Stock 2: 270000; Pricing 2: 10000=0.00392, 30000=0.00344, 50000=0.00316, 100000=0.00309 (USD); Features: Automotive AEC-Q200; ComponentLink4URL: http://www.mouser.com/ds/2/315/AOA0000CE1-37422.pdf; ComponentLink4Description: http://www.mouser.com/ds/2/315/AOA0000CE1-37422.pdf; ComponentLink5URL: http://www.farnell.com/datasheets/2059623.pdf; ComponentLink5Description: http://www.farnell.com/datasheets/2059623.pdf; ComponentLink6URL: http://www.industrial.panasonic.com/www-data/pdf/AOA0000/AOA0000CE1.pdf; ComponentLink6Description: http://www.industrial.panasonic.com/www-data/pdf/AOA0000/AOA0000CE1.pdf; ComponentLink7URL: http://www.farnell.com/datasheets/1678796.pdf; ComponentLink7Description: http://www.farnell.com/datasheets/1678796.pdf; Stock 3: 4674; Pricing 3: 1=0.11, 10=0.098, 100=0.0376, 1000=0.01654, 2500=0.01428 (USD); ComponentLink8URL: http://documents.rs-components.com/techlib://itc_doclist_GB.htm?stockno=6020016; ComponentLink8Description: http://documents.rs-components.com/techlib://itc_doclist_GB.htm?stockno=6020016; ComponentLink9URL: http://www.susumu.co.jp/common/pdf/n_catalog_partition05_en.pdf; ComponentLink9Description: http://www.susumu.co.jp/common/pdf/n_catalog_partition05_en.pdf; .SCHCHK: USED; Supplier 1: Digi-Key; Supplier Part Number 1: P62.0LDKR-ND
footprint R-0402
pins: 1, 2

## R-62R-0603
designator R?, comment 62R  Case Code (Imperial): 0603
RES SMD 62 OHM 5% 1/10W 0603; Manufacturer: Vishay Dale; Manufacturer Part Number: CRCW060362R0JNEA; Temperature Coefficient: 200ppm/°C; Max Power Dissipation: 100mW; Voltage Rating: 75V; .PCBCHK: USED; .Creator: F:TALI; Washability: OK; Stock 1: 202; Pricing 1: 1=0.1, 10=0.034, 100=0.0138, 1000=0.00618, 2500=0.00536 (USD); Case/Package: 0603; Number of Pins: 2; Weight: 7.1E-05oz; Case Code (Metric): 1608; Contact Plating: Tin; Min Operating Temperature: -55°C; Max Operating Temperature: 155°C; Packaging: Tape and Reel; Resistance: 62R; Tolerance: 5%; Composition: Thick Film; Military Standard: Not; Package Quantity: 1; Number of Terminations: 2; Power Rating: 100mW; Termination: SMD/SMT; Voltage Rating (DC): 75V; Features: Automotive AEC-Q200; Length: 1.55mm; Height: 0.02inch; Width: 0.033inch; Depth: 0.85mm; Radiation Hardening: No; REACH SVHC: Unknown; Lead Free: Lead Free; ComponentLink1URL: http://www.vishay.com/docs/20035/dcrcwe3.pdf; ComponentLink1Description: http://www.vishay.com/docs/20035/dcrcwe3.pdf; ComponentLink2URL: http://www.vishay.com/docs/20008/dcrcw.pdf; ComponentLink2Description: http://www.vishay.com/docs/20008/dcrcw.pdf; Stock 2: 198529; Pricing 2: 1=0.1, 10=0.043, 100=0.0176, 1000=0.00791, 2500=0.00686 (USD); Mount: Surface Mount; ComponentLink3URL: http://www.farnell.com/datasheets/2059623.pdf; ComponentLink3Description: http://www.farnell.com/datasheets/2059623.pdf; ComponentLink4URL: http://www.farnell.com/datasheets/1500035.pdf; ComponentLink4Description: http://www.farnell.com/datasheets/1500035.pdf; ComponentLink5URL: https://www.alliedelec.com/m/d/51cd0790071e1666bdb9d00c57fcf960.pdf; ComponentLink5Description: https://www.alliedelec.com/m/d/51cd0790071e1666bdb9d00c57fcf960.pdf; ComponentLink6URL: http://www.farnell.com/datasheets/1678796.pdf; ComponentLink6Description: http://www.farnell.com/datasheets/1678796.pdf; Stock 3: 13609; Pricing 3: 1=0.1, 10=0.026, 100=0.0107, 1000=0.00478, 2500=0.00415 (USD); Working Voltage: 75V; ComponentLink7URL: http://www.yageo.com/documents/recent/PYu-RC_Group_51_RoHS_L_9.pdf; ComponentLink7Description: http://www.yageo.com/documents/recent/PYu-RC_Group_51_RoHS_L_9.pdf; ComponentLink8URL: http://www.yageo.com.tw/exep/pages/download/literatures/PYu-R_INT-thick_7.pdf; ComponentLink8Description: http://www.yageo.com.tw/exep/pages/download/literatures/PYu-R_INT-thick_7.pdf; ComponentLink9URL: http://documents.rs-components.com/techlib://itc_doclist_GB.htm?stockno=6167547; ComponentLink9Description: http://documents.rs-components.com/techlib://itc_doclist_GB.htm?stockno=6167547; .SCHCHK: USED; Supplier 1: Digi-Key; Supplier Part Number 1: 541-62GCT-ND
footprint R-0603
pins: 1, 2

## R-62R-0805
designator R?, comment 62R  Case Code (Imperial): 0805
RES SMD 62 OHM 1% 1/8W 0805; Manufacturer: Yageo; Manufacturer Part Number: RC0805FR-0762RL; Temperature Coefficient: 100ppm/°C; Max Power Dissipation: 125mW; Voltage Rating: 150V; .PCBCHK: USED; .Creator: F:TALI; Washability: OK; Stock 1: 21919; Pricing 1: 1=0.1, 10=0.046, 100=0.0186, 1000=0.00835, 2500=0.00725 (USD); Mount: Surface Mount; Case/Package: 0805; Case Code (Metric): 2012; Min Operating Temperature: -55°C; Max Operating Temperature: 155°C; Tolerance: 1%; Resistance: 62R; Packaging: Tape and Reel; Composition: Thick Film; Number of Terminations: 2; Military Standard: Not; Power Rating: 125mW; Package Quantity: 1; Features: Moisture Resistant; Termination: SMD/SMT; Voltage Rating (DC): 150V; Length: 2mm; Height: 0.024inch; Width: 0.049inch; Depth: 1.25mm; Lead Free: Lead Free; ComponentLink1URL: http://www.mouser.com/ds/2/447/Yageo_08112016_RC0805-968729.pdf; ComponentLink1Description: http://www.mouser.com/ds/2/447/Yageo_08112016_RC0805-968729.pdf; ComponentLink2URL: http://www.yageo.com/documents/recent/PYu-RC_Group_51_RoHS_L_9.pdf; ComponentLink2Description: http://www.yageo.com/documents/recent/PYu-RC_Group_51_RoHS_L_9.pdf; ComponentLink3URL: http://www.yageo.com.tw/exep/pages/download/literatures/PYu-R_INT-thick_7.pdf; ComponentLink3Description: http://www.yageo.com.tw/exep/pages/download/literatures/PYu-R_INT-thick_7.pdf; Stock 2: 35874; Pricing 2: 1=0.39, 10=0.328, 100=0.1281, 1000=0.05364, 2500=0.04917 (USD); Number of Pins: 2; Contact Plating: Tin; Radiation Hardening: No; REACH SVHC: No SVHC; ComponentLink4URL: http://www.farnell.com/datasheets/485442.pdf; ComponentLink4Description: http://www.farnell.com/datasheets/485442.pdf; ComponentLink5URL: http://industrial.panasonic.com/www-data/pdf/AOA0000/AOA0000CE26.pdf; ComponentLink5Description: http://industrial.panasonic.com/www-data/pdf/AOA0000/AOA0000CE26.pdf; ComponentLink6URL: https://www.distrelec.biz/Web/Downloads/_t/ds/ERA_eng_tds.pdf?mime=application%2Fpdf; ComponentLink6Description: https://www.distrelec.biz/Web/Downloads/_t/ds/ERA_eng_tds.pdf?mime=application%2Fpdf; ComponentLink7URL: https://produktinfo.conrad.com/datenblaetter/450000-474999/452632-da-01-en-WIDERSTAND_0805_ERA.pdf; ComponentLink7Description: https://produktinfo.conrad.com/datenblaetter/450000-474999/452632-da-01-en-WIDERSTAND_0805_ERA.pdf; Stock 3: 86097; Pricing 3: 1=0.1, 10=0.074, 100=0.0301, 1000=0.01354, 2500=0.01175 (USD); ComponentLink8URL: http://www.farnell.com/datasheets/1678782.pdf; ComponentLink8Description: http://www.farnell.com/datasheets/1678782.pdf; ComponentLink9URL: http://www.mouser.com/ds/2/315/AOA0000C283-1093288.pdf; ComponentLink9Description: http://www.mouser.com/ds/2/315/AOA0000C283-1093288.pdf; .SCHCHK: USED; Supplier 1: Digi-Key; Supplier Part Number 1: 311-62.0CRDKR-ND
footprint R-0805
pins: 1, 2

## R-69K8-0603
designator R?, comment 69.8K  Case Code (Imperial): 0603
RES 69.8K OHM 1% 1/10W 0603; Manufacturer: Stackpole Electronics; Manufacturer Part Number: RMCF0603FT69K8; Resistance: 69.8kR; Power Rating: 100mW; Temperature Coefficient: 100ppm/°C; .Creator: F:TALI; .PCBCHK: USED; Washability: OK; Supplier 1: Digi-Key; Stock 1: 23571; Pricing 1: 1=0.1, 10=0.018, 100=0.0071, 1000=0.00321, 2500=0.00278 (USD); Mount: Surface Mount; Case/Package: 0603; Case Code (Metric): 1608; Contact Plating: Matte,Tin; Min Operating Temperature: -55°C; Max Operating Temperature: 155°C; Tolerance: 1%; Packaging: Tape and Reel; Composition: Thick Film; Number of Terminations: 2; Max Power Dissipation: 100mW; Features: Automotive AEC-Q200; Length: 0.061inch; Height: 0.022inch; Width: 0.031inch; Radiation Hardening: No; Lead Free: Lead Free; Supplier Part Number 1: RMCF0603FT69K8DKR-ND; .SCHCHK: USED
footprint R-0603
pins: 1, 2

## R-69K8-0805
designator R?, comment 69K8  Case/Package: 0805